# Altium footprint library default_60.PcbLib: 18 footprints (part 2 of 2)
Each footprint in its own frame and in the unit in brackets; x right, y up, seen from the top. Pads: shape width x height; smd on the part's side, far side on the other; paste and mask are expansions set on the pad; w line width, h text height; cw(c..) or ccw(c..) is an arc to the next point about the centre after c.
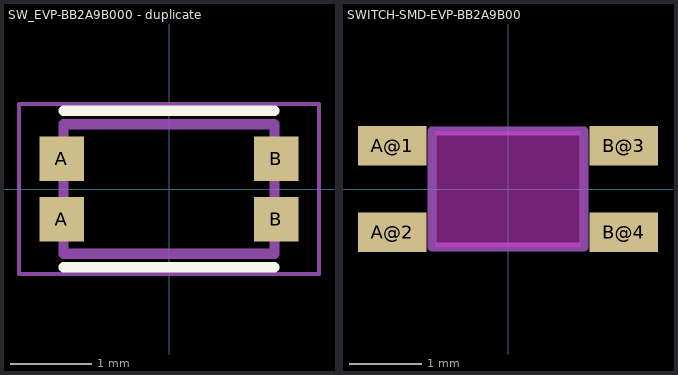
[diagram p1: the footprints below, top view; thin cyan lines are the x and y axes]

## SW_EVP-BB2A9B000 - duplicate [mm]
pads (4):
  rect 0.55x0.55 smd paste-1: A(-1.325,-0.375) A(-1.325,0.375) B(1.325,-0.375) B(1.325,0.375)
Top Overlay:
  lines w0.127: -1.3,-0.964 1.3,-0.964 ; -1.3,0.964 1.3,0.964
Top Paste:
  region: -1.1,0.15 -1.55,0.15 -1.55,0.6 -1.1,0.6
  region: -1.1,-0.6 -1.55,-0.6 -1.55,-0.15 -1.1,-0.15
  region: 1.55,0.15 1.1,0.15 1.1,0.6 1.55,0.6
  region: 1.55,-0.6 1.1,-0.6 1.1,-0.15 1.55,-0.15
Mechanical 13:
  lines w0.127: -1.3,-0.8 1.3,-0.8 1.3,0.8 -1.3,0.8 -1.3,-0.8
Mechanical 15:
  lines w0.05: -1.85,-1.05 1.85,-1.05 1.85,1.05 -1.85,1.05 -1.85,-1.05
3D body "User Library-EVPBB2A9B000.step": height 0.54, standoff 0.01, extent -1.475,-0.925 1.525,0.875

## SWITCH-SMD-EVP-BB2A9B00 [mil]
pads (4):
  rect 37.4x21.65 smd: A@1(-62.99,23.62) A@2(-62.99,-23.62) B@3(62.99,23.62) B@4(62.99,-23.62)
Top Layer keep-out:
  region: -39.37,31.5 -39.37,-31.5 39.37,-31.5 39.37,31.5
Mechanical 7:
  lines w5: -41.34,-31.5 41.34,-31.5 41.34,31.5 -41.34,31.5 -41.34,-31.5
3D body "User Library-EVPBB2A9B000.step": height 20.38, standoff -0.48, extent -55.12,-34.45 62.99,36.42